# Altium footprint library my Library.PcbLib: 1247 footprints (part 69 of 78)
Each footprint in its own frame and in the unit in brackets; x right, y up, seen from the top. Pads: shape width x height; smd on the part's side, far side on the other; paste and mask are expansions set on the pad; w line width, h text height; cw(c..) or ccw(c..) is an arc to the next point about the centre after c.
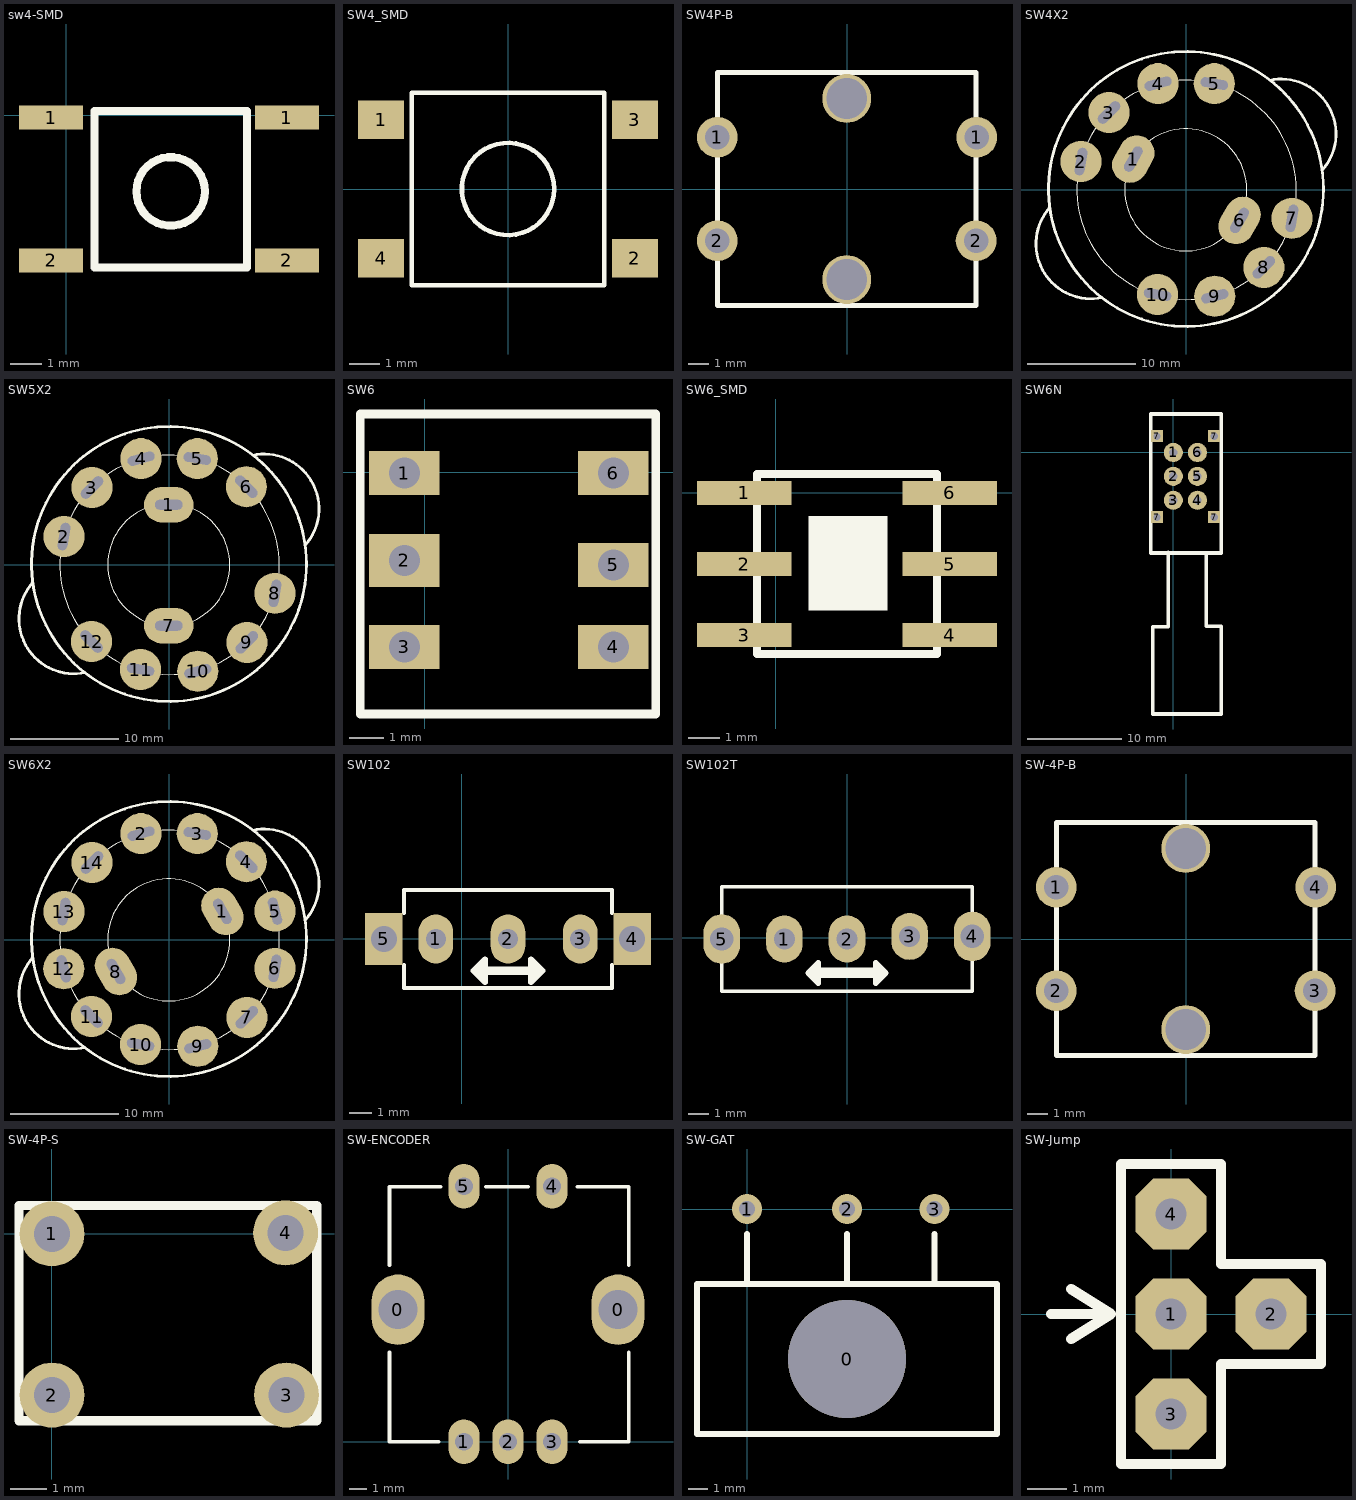
[diagram p68: the footprints below, top view; thin cyan lines are the x and y axes]

## sw4-SMD [mil]
pads (4):
  rect 80x30 smd: 1(-19,-3) 1(275,-3) 2(-19,-181) 2(275,-181)
Top Overlay:
  circle w10: c130,-95 r42.72
  lines w10: 35,-190 35,5 225,5 225,-190 35,-190
3D body "User Library-TS-1143S-WP.STEP": height 169.29, standoff 0, extent -29.49,-219.96 285.47,35.95

## SW4_SMD [mil] "SW SMD button 4pin, 250 x250 mil"
height 100
pads (4):
  rect 60x50 smd: 1(-165,90) 2(165,-90) 3(165,90) 4(-165,-90)
Top Overlay:
  circle w6: c0,0 r60
  lines w6: -125,-125 125,-125 125,125 -125,125 -125,-125
3D body: height 20, standoff 0, extent -180,-105 -125,-75
3D body: height 20, standoff 0, extent -180,75 -125,105
3D body: height 20, standoff 0, extent 125,75 180,105
3D body: height 20, standoff 0, extent 125,-105 180,-75
3D body: height 80, standoff 10, extent -125,-125 125,125
3D body: height 130, standoff 80, extent -59.76,-59.88 59.76,59.88

## SW4P-B [mm] "Nut bam lon"
pads (6):
  round 2 hole 1.2: 1(-6.375,2.54) 1(6.35,2.54) 2(-6.375,-2.54) 2(6.325,-2.54)
  round 2.4 hole 2: ""(-0.025,-4.445) ""(-0.025,4.445)
Top Overlay:
  lines w0.254: -6.375,-5.715 6.325,-5.715 6.325,5.715 -6.375,5.715 -6.375,-5.715
3D body "User Library-Button-BIG-4.step": height 9.5, standoff -3.5, extent -6.936,-6 6.937,6

## SW4X2 [mil] "Switch 4x2"
height 500
pads (10):
  oval 180x130 hole 35 slot 100 at 60 deg rot 60: 1(-193.57,112.51) 6(193.7,-111.07)
  round 150 hole 35 slot 100 at 80 deg: 2(-384.48,103.48) 7(384.48,-103.48)
  round 150 hole 35 slot 100 at 45 deg: 3(-282.26,282.26) 8(282.26,-282.26)
  round 150 hole 35 slot 100 at 15 deg: 4(-103.48,387.48) 9(103.48,-387.48)
  round 150 hole 35 slot 100 at 170 deg: 5(101.54,387.46) 10(-105.2,-381.27)
Top Overlay:
  circle w10: c-1.46,3.46 r501
  circle w1: c0.54,0.46 r400
  circle w1: c-2.46,0.46 r222.5
  lines w10: -498,-63.94 ccw(c-348.29,-196.56) -307.65,-392.38 ; 303.52,399.93 cw(c345.18,204.32) 495.11,71.95

## SW5X2 [mil] "Switch 5x2"
height 500
pads (12):
  oval 180x130 hole 35 slot 100 at 0 deg: 1(-2.46,219.46) 7(-2.46,-221.54)
  round 150 hole 35 slot 100 at 80 deg: 2(-384.48,103.48) 8(384.48,-103.48)
  round 150 hole 35 slot 100 at 45 deg: 3(-282.26,282.26) 9(282.26,-282.26)
  round 150 hole 35 slot 100 at 15 deg: 4(-103.48,387.48) 10(103.48,-387.48)
  round 150 hole 35 slot 100 at 170 deg: 5(101.54,387.46) 11(-105.2,-381.27)
  round 150 hole 35 slot 100 at 135 deg: 6(280.32,285.24) 12(-283.98,-279.05)
Top Overlay:
  circle w1: c-2.46,0.46 r222.5
  circle w1: c0.54,0.46 r400
  circle w10: c-1.46,3.46 r501
  lines w10: -498,-63.94 ccw(c-348.29,-196.56) -307.65,-392.38 ; 303.52,399.93 cw(c345.18,204.32) 495.11,71.95

## SW6 [mil]
pads (6):
  rect 80x50 hole 35: 1(-23,-1) 3(-23,-198) 4(214,-198) 5(214,-105) 6(214,-1)
  rect 80x60 hole 35: 2(-23,-100)
Top Overlay:
  lines w10: -73,-274 -73,66 262,66 262,-274 -73,-274
3D body "User Library-ZIPPY_P1-1S_8x8_Push_switch_lock.STEP": height 524.22, standoff -145.07, extent -62.48,-265.35 252.48,57.48

## SW6_SMD [mil]
pads (6):
  rect 120x30 smd: 1(-40,0) 2(-40,-90) 3(-40,-180) 4(220,-180) 5(220,-90) 6(220,0)
Top Overlay:
  region: 141,-149 141,-29 41,-29 41,-149
  lines w10: -24,-204 204,-204 204,24 -24,24 -24,-204

## SW6N [mil]
pads (10):
  round 80 hole 35: 1(0,0) 2(0,-100) 3(0,-200) 4(101,-200) 5(101,-100) 6(101,0)
  rect 50x50 hole 30 square: 7(-69,-271) 7(-69,68) 7(171,-271) 7(171,68)
Top Overlay:
  lines w15: -21,-419 -21,-730 -87,-730 -87,-1095 201,-1095 201,-728 137,-728 137,-421 142,-421 ; -95,-421 200,-421 200,161 -95,161 -95,-421
3D body "User Library-DPDT Push Switch-1.STEP": height 394.31, standoff -156.88, extent -95,-1096.66 200.28,161.56

## SW6X2 [mil] "Switch 6x2"
height 500
pads (14):
  oval 180x130 hole 35 slot 100 at 120 deg rot 120: 1(193,104) 8(-195,-115)
  round 150 hole 35 slot 100 at 15 deg: 2(-103.48,387.48) 9(103.48,-387.48)
  round 150 hole 35 slot 100 at 170 deg: 3(101.54,387.46) 10(-105.2,-381.27)
  round 150 hole 35 slot 100 at 135 deg: 4(280.32,285.24) 11(-283.98,-279.05)
  round 150 hole 35 slot 100 at 105 deg: 5(385,105) 12(-385,-105)
  round 150 hole 35 slot 100 at 80 deg: 6(384.48,-103.48) 13(-384.48,103.48)
  round 150 hole 35 slot 100 at 45 deg: 7(282.26,-282.26) 14(-282.26,282.26)
Top Overlay:
  circle w10: c-1.46,3.46 r501
  circle w1: c0.54,0.46 r400
  circle w1: c-2.46,0.46 r222.5
  lines w10: -498,-63.94 ccw(c-348.29,-196.56) -307.65,-392.38 ; 303.52,399.93 cw(c345.18,204.32) 495.11,71.95

## SW102 [mil] "Switch 102 On Board nho"
height 2
pads (5):
  oval 60x85 hole 35: 1(-45,0) 2(80,0) 3(205,0)
  rect 65x90 hole 45 square: 4(295,0) 5(-135,0)
Top Overlay:
  lines w7: -100,-45 -100,-85 260,-85 260,-45 ; -100,45 -100,85 260,85 260,45
  lines w10: 20,-55 40,-35 40,-75 20,-55 ; 120,-75 120,-35 140,-55 120,-75
  lines w15: 30,-55 130,-55
3D body "User Library-1825115-1.STEP": height 383.6, standoff -169.4, extent -136.5,-110 296.5,110

## SW102T [mil] "Switch 102 On Board To"
height 2
pads (5):
  oval 70x90 hole 40: 1(-120,-2.5) 2(0,-2.5) 3(120,2.5)
  oval 70x95 hole 45: 4(240,2.5) 5(-240,-2.5)
Top Overlay:
  lines w7: -240,-50 -240,-102.5 240,-102.5 240,-45 ; -240,45 -240,97.5 240,97.5 240,45
  lines w10: -75,-67.5 -55,-47.5 -55,-87.5 -75,-67.5 ; 55,-87.5 55,-47.5 75,-67.5 55,-87.5
  lines w20: -65,-67.5 65,-67.5

## SW-4P-B [mm] "Nut bam lon"
pads (6):
  round 2 hole 1.2: 1(-6.375,2.54) 2(-6.375,-2.54) 3(6.325,-2.54) 4(6.35,2.54)
  round 2.4 hole 2: ""(-0.025,-4.445) ""(-0.025,4.445)
Top Overlay:
  lines w0.254: -6.375,-5.715 6.325,-5.715 6.325,5.715 -6.375,5.715 -6.375,-5.715
3D body "User Library-Button-BIG-4.step": height 9.5, standoff -3.5, extent -6.936,-6 6.937,6

## SW-4P-S [mm]
height 5.59
pads (4):
  round 1.8 hole 1: 1(0,0) 2(0,-4.47) 3(6.502,-4.47) 4(6.477,0.025)
Top Overlay:
  lines w0.254: -0.914,-5.182 7.341,-5.182 7.341,0.787 6.934,0.787 -0.914,0.787 -0.914,-5.182
3D body "User Library-Button-small-4pin.step": height 9.52, standoff -3.48, extent -0.864,-5.235 7.348,0.765

## SW-ENCODER [mm] "SW-ENCODER"
pads (7):
  oval 3x4 hole 2.2: 0(-6.25,7.5) 0(6.25,7.5)
  oval 1.778x2.54 hole 1: 1(-2.5,0) 2(0,0) 3(2.5,0) 4(2.5,14.5) 5(-2.5,14.5)
Top Overlay:
  lines w0.203: -6.731,5.08 -6.731,0 -3.937,0 ; -6.731,10.033 -6.731,14.478 -3.81,14.478 ; -1.27,14.478 1.143,14.478 ; 3.937,14.478 6.858,14.478 6.858,10.033 ; 4.064,0 6.858,0 6.858,5.08

## SW-GAT [mm]
pads (4):
  round 6 hole 6: 0(5.08,-7.62)
  round 1.524 hole 0.8: 1(0,0) 2(5.08,0) 3(9.525,0)
Top Overlay:
  lines w0.305: 0,-3.81 0,-1.27 ; 5.08,-3.81 5.08,-1.27 ; 9.525,-3.81 9.525,-1.27 ; -2.54,-11.43 -2.54,-3.81 12.7,-3.81 12.7,-11.43 -2.54,-11.43

## SW-Jump [mm]
pads (4):
  oct 1.8x1.8 hole 0.8: 1(0,0) 2(2.54,0) 3(0,-2.54) 4(0,2.54)
Top Overlay:
  lines w0.254: -3.048,0 -1.524,0 ; -2.54,-0.635 -1.524,0 ; -2.54,0.635 -1.524,0 ; -1.27,-3.81 1.27,-3.81 1.27,-1.27 3.81,-1.27 3.81,1.27 1.27,1.27 1.27,3.81 -1.27,3.81 -1.27,-1.27 -1.27,1.27 -1.27,-3.81